# Altium footprint library komponenty_ITS_v1.PcbLib: 81 footprints (part 6 of 6)
Each footprint in its own frame and in the unit in brackets; x right, y up, seen from the top. Pads: shape width x height; smd on the part's side, far side on the other; paste and mask are expansions set on the pad; w line width, h text height; cw(c..) or ccw(c..) is an arc to the next point about the centre after c.
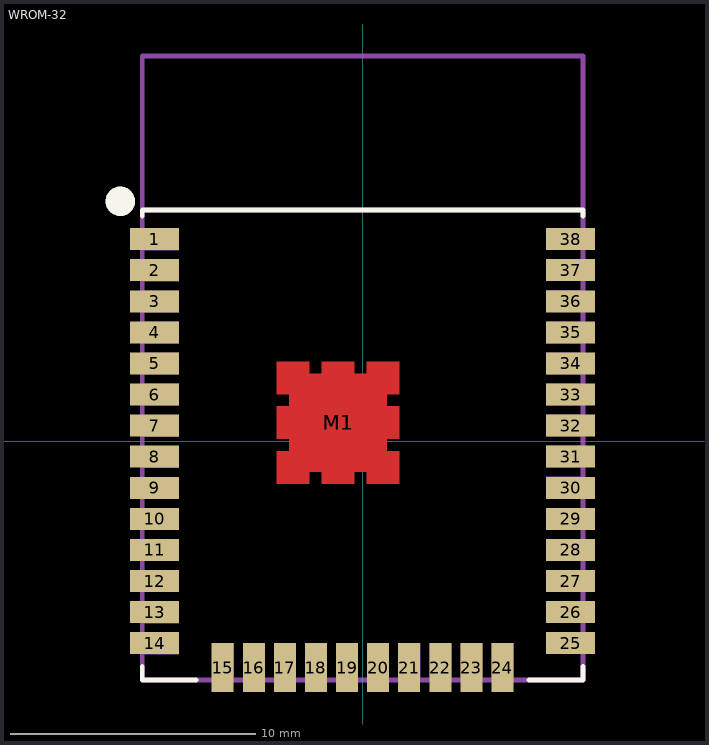
[diagram p5: the footprint, top view; thin cyan lines are the x and y axes]

## WROM-32 [mm]
pads (40):
  rect 2x0.9 smd: 1(-8.5,8.255) 2(-8.5,6.985) 3(-8.5,5.715) 4(-8.5,4.445) 5(-8.5,3.175) 6(-8.5,1.905) 7(-8.5,0.635) 8(-8.5,-0.635) 9(-8.5,-1.905) 10(-8.5,-3.175) 11(-8.5,-4.445) 12(-8.5,-5.715) 13(-8.5,-6.985) 14(-8.5,-8.255) 25(8.5,-8.255) 26(8.5,-6.985) 27(8.5,-5.715) 28(8.5,-4.445) 29(8.5,-3.175) 30(8.5,-1.905) 31(8.5,-0.635) 32(8.5,0.635) 33(8.5,1.905) 34(8.5,3.175) 35(8.5,4.445) 36(8.5,5.715) 37(8.5,6.985) 38(8.5,8.255)
  rect 0.9x2 smd: 15(-5.715,-9.255) 16(-4.445,-9.255) 17(-3.175,-9.255) 18(-1.905,-9.255) 19(-0.635,-9.255) 20(0.635,-9.255) 21(1.905,-9.255) 22(3.175,-9.255) 23(4.445,-9.255) 24(5.715,-9.255)
  rect 1.33x1.33 on Top Paste mask+0: M1(-1,0.755) M1(-1,0.755)
Top Layer:
  region: -3.5,-1.745 -2.17,-1.745 -2.17,-1.24 -1.665,-1.24 -1.665,-1.745 -0.335,-1.745 -0.335,-1.24 0.17,-1.24 0.17,-1.745 1.5,-1.745 1.5,-0.415 0.995,-0.415 0.995,0.09 1.5,0.09 1.5,1.42 0.995,1.42 0.995,1.925 1.5,1.925 1.5,3.255 0.17,3.255 0.17,2.75 -0.335,2.75 -0.335,3.255 -1.665,3.255 -1.665,2.75 -2.17,2.75 -2.17,3.255 -3.5,3.255 -3.5,1.925 -2.995,1.925 -2.995,1.42 -3.5,1.42 -3.5,0.09 -2.995,0.09 -2.995,-0.415 -3.5,-0.415
  pour cut-out: -2.17,0.915 -2.17,1.42 -2.675,1.42 -2.675,1.925 -2.17,1.925 -2.17,2.43 -1.665,2.43 -1.665,1.925 -1.16,1.925 -1.16,1.42 -1.665,1.42 -1.665,0.915
  pour cut-out: -0.84,1.42 -0.335,1.42 -0.335,0.915 0.17,0.915 0.17,1.42 0.675,1.42 0.675,1.925 0.17,1.925 0.17,2.43 -0.335,2.43 -0.335,1.925 -0.84,1.925
  pour cut-out: -0.84,-0.415 -0.84,0.09 -0.335,0.09 -0.335,0.595 0.17,0.595 0.17,0.09 0.675,0.09 0.675,-0.415 0.17,-0.415 0.17,-0.92 -0.335,-0.92 -0.335,-0.415
  pour cut-out: -2.675,-0.415 -2.675,0.09 -2.17,0.09 -2.17,0.595 -1.665,0.595 -1.665,0.09 -1.16,0.09 -1.16,-0.415 -1.665,-0.415 -1.665,-0.92 -2.17,-0.92 -2.17,-0.415
Top Overlay:
  circle w0.6: c-9.9,9.8 r0.3
  lines w0.2: -9,-9.2 -9,-9.756 -6.8,-9.756 ; -9,9.2 -9,9.448 9,9.448 9,9.2 ; 6.8,-9.754 9.003,-9.754 9.003,-9.198
Top Paste:
  rectangle: -3.5,-1.745 -2.17,-0.415
  rectangle: -3.5,0.09 -2.17,1.42
  rectangle: -1.665,-1.745 -0.335,-0.415
  rectangle: -1.665,0.09 -0.335,1.42
  rectangle: 0.17,-1.745 1.5,-0.415
  rectangle: 0.17,0.09 1.5,1.42
  rectangle: -3.5,1.925 -2.17,3.255
  rectangle: -1.665,1.925 -0.335,3.255
  rectangle: 0.17,1.925 1.5,3.255
Top Solder:
  rectangle: -3.5,1.925 -2.17,3.255
  rectangle: -1.665,1.925 -0.335,3.255
  rectangle: 0.17,1.925 1.5,3.255
  rectangle: 0.17,0.09 1.5,1.42
  rectangle: -1.665,0.09 -0.335,1.42
  rectangle: -3.5,0.09 -2.17,1.42
  rectangle: -3.5,-1.745 -2.17,-0.415
  rectangle: -1.665,-1.745 -0.335,-0.415
  rectangle: 0.17,-1.745 1.5,-0.415
Top M11-12_SMOT:
  circle w0.6: c-9.9,9.8 r0.3
  region: -2.72,-9.755 -2.72,-8.255 -3.62,-8.255 -3.62,-9.755
  region: -2.327,-0.57 -3.361,-0.57 -3.361,-1.57 -2.327,-1.57
  region: -2.327,1.265 -3.361,1.265 -3.361,0.265 -2.327,0.265
  region: -2.327,3.1 -3.361,3.1 -3.361,2.1 -2.327,2.1
  region: -0.18,-9.755 -0.18,-8.255 -1.08,-8.255 -1.08,-9.755
  region: -0.492,-0.57 -1.526,-0.57 -1.526,-1.57 -0.492,-1.57
  region: -0.492,1.265 -1.526,1.265 -1.526,0.265 -0.492,0.265
  region: -0.492,3.1 -1.526,3.1 -1.526,2.1 -0.492,2.1
  region: 1.09,-9.755 1.09,-8.255 0.19,-8.255 0.19,-9.755
  region: 1.343,-0.57 0.309,-0.57 0.309,-1.57 1.343,-1.57
  region: 1.343,1.265 0.309,1.265 0.309,0.265 1.343,0.265
  region: 1.343,3.1 0.309,3.1 0.309,2.1 1.343,2.1
  region: 3.63,-9.755 3.63,-8.255 2.73,-8.255 2.73,-9.755
  region: -1.45,-9.755 -1.45,-8.255 -2.35,-8.255 -2.35,-9.755
  region: -3.99,-9.755 -3.99,-8.255 -4.89,-8.255 -4.89,-9.755
  region: -5.26,-9.755 -5.26,-8.255 -6.16,-8.255 -6.16,-9.755
  rectangle: -9,-7.44 -7.5,-6.54
  rectangle: -9,-3.63 -7.5,-2.73
  rectangle: -9,-1.09 -7.5,-0.19
  rectangle: -9,0.18 -7.5,1.08
  rectangle: -9,2.72 -7.5,3.62
  rectangle: -9,6.53 -7.5,7.43
  region: 6.17,-9.755 6.17,-8.255 5.27,-8.255 5.27,-9.755
  region: 4.9,-9.755 4.9,-8.255 4,-8.255 4,-9.755
  region: 2.36,-9.755 2.36,-8.255 1.46,-8.255 1.46,-9.755
  region: 9,-6.53 7.5,-6.53 7.5,-7.43 9,-7.43
  region: 9,-2.72 7.5,-2.72 7.5,-3.62 9,-3.62
  region: 9,-0.18 7.5,-0.18 7.5,-1.08 9,-1.08
  region: 9,1.09 7.5,1.09 7.5,0.19 9,0.19
  region: 9,3.63 7.5,3.63 7.5,2.73 9,2.73
  region: 9,7.44 7.5,7.44 7.5,6.54 9,6.54
  rectangle: -9,-8.71 -7.5,-7.81
  rectangle: -9,-6.17 -7.5,-5.27
  rectangle: -9,-4.9 -7.5,-4
  rectangle: -9,-2.36 -7.5,-1.46
  rectangle: -9,1.45 -7.5,2.35
  rectangle: -9,3.99 -7.5,4.89
  rectangle: -9,5.26 -7.5,6.16
  rectangle: -9,7.8 -7.5,8.7
  region: 9,-1.45 7.5,-1.45 7.5,-2.35 9,-2.35
  region: 9,-3.99 7.5,-3.99 7.5,-4.89 9,-4.89
  region: 9,-5.26 7.5,-5.26 7.5,-6.16 9,-6.16
  region: 9,-7.8 7.5,-7.8 7.5,-8.7 9,-8.7
  region: 9,6.17 7.5,6.17 7.5,5.27 9,5.27
  region: 9,4.9 7.5,4.9 7.5,4 9,4
  region: 9,2.36 7.5,2.36 7.5,1.46 9,1.46
  region: 9,8.71 7.5,8.71 7.5,7.81 9,7.81
  lines w0.2: -9,-9.763 -9,15.742 9,15.742 9,-9.763 -9,-9.763
Top M13-14_SDES:
  text "'.Designator'" at -5.665,5.883 h1
M15_orgin:
  lines w0.2: -9,9.445 9,9.445 ; -9,-9.755 9,-9.755 9,15.745 -9,15.745 -9,-9.755
3D body "wrom32_ESP321.step": height 2.92, standoff 0.01, extent -8.95,-9.8 9.05,15.7